# Altium footprint library SMDLibrary.PcbLib: 309 footprints (part 1 of 20)
Each footprint in its own frame and in the unit in brackets; x right, y up, seen from the top. Pads: shape width x height; smd on the part's side, far side on the other; paste and mask are expansions set on the pad; w line width, h text height; cw(c..) or ccw(c..) is an arc to the next point about the centre after c.
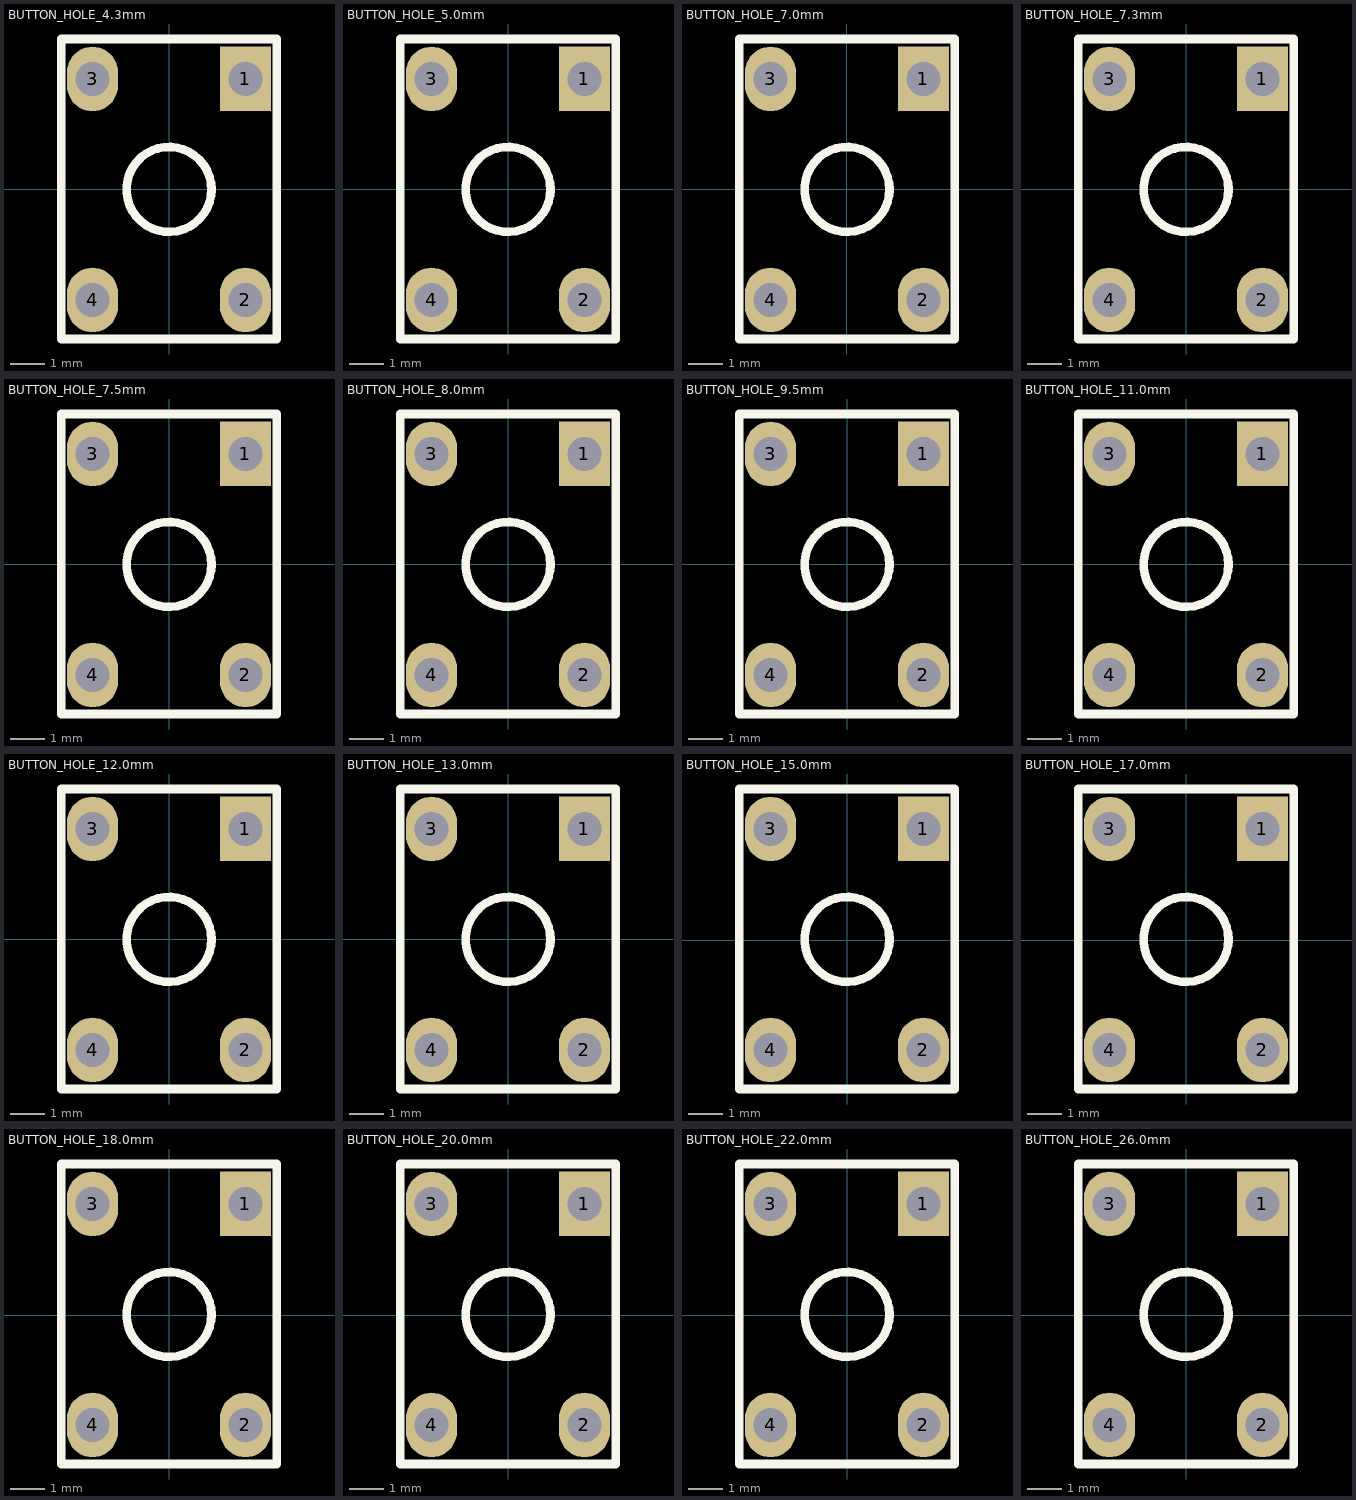
[diagram p0: the footprints below, top view; thin cyan lines are the x and y axes]

## BUTTON_HOLE_4.3mm [mm]
pads (4):
  rect 1.5x1.9 hole 1: 1(2.25,3.25)
  oval 1.5x1.9 hole 1: 2(2.25,-3.25) 3(-2.25,3.25) 4(-2.25,-3.25)
Top Overlay:
  circle w0.254: c0,0 r1.25
  lines w0.254: -3.175,-4.4 3.175,-4.4 3.175,4.425 -3.175,4.425 -3.175,-4.4
3D body "button_hole_6x6x4.3.stp": height 4.3, standoff -3.5, extent -3,-3.863 3,3.863

## BUTTON_HOLE_5.0mm [mm]
pads (4):
  rect 1.5x1.9 hole 1: 1(2.25,3.25)
  oval 1.5x1.9 hole 1: 2(2.25,-3.25) 3(-2.25,3.25) 4(-2.25,-3.25)
Top Overlay:
  circle w0.254: c0,0 r1.25
  lines w0.254: -3.175,-4.4 3.175,-4.4 3.175,4.425 -3.175,4.425 -3.175,-4.4
3D body "button_hole_6x6x5.0.stp": height 5, standoff -3.5, extent -3,-3.863 3,3.863

## BUTTON_HOLE_7.0mm [mm]
pads (4):
  rect 1.5x1.9 hole 1: 1(2.25,3.25)
  oval 1.5x1.9 hole 1: 2(2.25,-3.25) 3(-2.25,3.25) 4(-2.25,-3.25)
Top Overlay:
  circle w0.254: c0,0 r1.25
  lines w0.254: -3.175,-4.4 3.175,-4.4 3.175,4.425 -3.175,4.425 -3.175,-4.4
3D body "button_hole_6x6x7.0.stp": height 7, standoff -3.5, extent -3,-3.863 3,3.863

## BUTTON_HOLE_7.3mm [mm]
pads (4):
  rect 1.5x1.9 hole 1: 1(2.25,3.25)
  oval 1.5x1.9 hole 1: 2(2.25,-3.25) 3(-2.25,3.25) 4(-2.25,-3.25)
Top Overlay:
  circle w0.254: c0,0 r1.25
  lines w0.254: -3.175,-4.4 3.175,-4.4 3.175,4.425 -3.175,4.425 -3.175,-4.4
3D body "button_hole_6x6x7.3.stp": height 7.3, standoff -3.5, extent -3,-3.863 3,3.864

## BUTTON_HOLE_7.5mm [mm]
pads (4):
  rect 1.5x1.9 hole 1: 1(2.25,3.25)
  oval 1.5x1.9 hole 1: 2(2.25,-3.25) 3(-2.25,3.25) 4(-2.25,-3.25)
Top Overlay:
  circle w0.254: c0,0 r1.25
  lines w0.254: -3.175,-4.4 3.175,-4.4 3.175,4.425 -3.175,4.425 -3.175,-4.4
3D body "button_hole_6x6x7.5.stp": height 7.5, standoff -3.5, extent -3,-3.863 3,3.863

## BUTTON_HOLE_8.0mm [mm]
pads (4):
  rect 1.5x1.9 hole 1: 1(2.25,3.25)
  oval 1.5x1.9 hole 1: 2(2.25,-3.25) 3(-2.25,3.25) 4(-2.25,-3.25)
Top Overlay:
  circle w0.254: c0,0 r1.25
  lines w0.254: -3.175,-4.4 3.175,-4.4 3.175,4.425 -3.175,4.425 -3.175,-4.4
3D body "button_hole_6x6x8.0.stp": height 8, standoff -3.5, extent -3,-3.863 3,3.863

## BUTTON_HOLE_9.5mm [mm]
pads (4):
  rect 1.5x1.9 hole 1: 1(2.25,3.25)
  oval 1.5x1.9 hole 1: 2(2.25,-3.25) 3(-2.25,3.25) 4(-2.25,-3.25)
Top Overlay:
  circle w0.254: c0,0 r1.25
  lines w0.254: -3.175,-4.4 -3.175,4.425 3.175,4.425 3.175,-4.4 -3.175,-4.4
3D body "button_hole_6x6x9.5.stp": height 9.5, standoff -3.5, extent -3,-3.863 3,3.863

## BUTTON_HOLE_11.0mm [mm]
pads (4):
  rect 1.5x1.9 hole 1: 1(2.25,3.25)
  oval 1.5x1.9 hole 1: 2(2.25,-3.25) 3(-2.25,3.25) 4(-2.25,-3.25)
Top Overlay:
  circle w0.254: c0,0 r1.25
  lines w0.254: -3.175,-4.4 -3.175,4.425 3.175,4.425 3.175,-4.4 -3.175,-4.4
3D body "button_hole_6x6x11.0.stp": height 11, standoff -3.5, extent -3,-3.863 3,3.863

## BUTTON_HOLE_12.0mm [mm]
pads (4):
  rect 1.5x1.9 hole 1: 1(2.25,3.25)
  oval 1.5x1.9 hole 1: 2(2.25,-3.25) 3(-2.25,3.25) 4(-2.25,-3.25)
Top Overlay:
  circle w0.254: c0,0 r1.25
  lines w0.254: -3.175,-4.4 -3.175,4.425 3.175,4.425 3.175,-4.4 -3.175,-4.4
3D body "button_hole_6x6x12.0.stp": height 12, standoff -3.5, extent -3,-3.863 3,3.863

## BUTTON_HOLE_13.0mm [mm]
pads (4):
  rect 1.5x1.9 hole 1: 1(2.25,3.25)
  oval 1.5x1.9 hole 1: 2(2.25,-3.25) 3(-2.25,3.25) 4(-2.25,-3.25)
Top Overlay:
  circle w0.254: c0,0 r1.25
  lines w0.254: -3.175,-4.4 -3.175,4.425 3.175,4.425 3.175,-4.4 -3.175,-4.4
3D body "button_hole_6x6x13.0.stp": height 13, standoff -3.5, extent -3,-3.863 3,3.863

## BUTTON_HOLE_15.0mm [mm]
pads (4):
  rect 1.5x1.9 hole 1: 1(2.25,3.275)
  oval 1.5x1.9 hole 1: 2(2.25,-3.225) 3(-2.25,3.275) 4(-2.25,-3.225)
Top Overlay:
  circle w0.254: c0,0.025 r1.25
  lines w0.254: -3.175,-4.375 3.175,-4.375 3.175,4.45 -3.175,4.45 -3.175,-4.375
3D body "button_hole_6x6x15.0.stp": height 15, standoff -3.5, extent -3,-3.863 3,3.863

## BUTTON_HOLE_17.0mm [mm]
pads (4):
  rect 1.5x1.9 hole 1: 1(2.25,3.275)
  oval 1.5x1.9 hole 1: 2(2.25,-3.225) 3(-2.25,3.275) 4(-2.25,-3.225)
Top Overlay:
  circle w0.254: c0,0.025 r1.25
  lines w0.254: -3.175,-4.375 -3.175,4.45 3.175,4.45 3.175,-4.375 -3.175,-4.375
3D body "button_hole_6x6x17.0.stp": height 17, standoff -3.5, extent -3,-3.863 3,3.863

## BUTTON_HOLE_18.0mm [mm]
pads (4):
  rect 1.5x1.9 hole 1: 1(2.25,3.275)
  oval 1.5x1.9 hole 1: 2(2.25,-3.225) 3(-2.25,3.275) 4(-2.25,-3.225)
Top Overlay:
  circle w0.254: c0,0.025 r1.25
  lines w0.254: -3.175,-4.375 -3.175,4.45 3.175,4.45 3.175,-4.375 -3.175,-4.375
3D body "button_hole_6x6x18.0.stp": height 18, standoff -3.5, extent -3,-3.863 3,3.863

## BUTTON_HOLE_20.0mm [mm]
pads (4):
  rect 1.5x1.9 hole 1: 1(2.25,3.275)
  oval 1.5x1.9 hole 1: 2(2.25,-3.225) 3(-2.25,3.275) 4(-2.25,-3.225)
Top Overlay:
  circle w0.254: c0,0.025 r1.25
  lines w0.254: -3.175,-4.375 -3.175,4.45 3.175,4.45 3.175,-4.375 -3.175,-4.375
3D body "button_hole_6x6x20.0.stp": height 20, standoff -3.5, extent -3,-3.863 3,3.863

## BUTTON_HOLE_22.0mm [mm]
pads (4):
  rect 1.5x1.9 hole 1: 1(2.25,3.275)
  oval 1.5x1.9 hole 1: 2(2.25,-3.225) 3(-2.25,3.275) 4(-2.25,-3.225)
Top Overlay:
  circle w0.254: c0,0.025 r1.25
  lines w0.254: -3.175,-4.375 -3.175,4.45 3.175,4.45 3.175,-4.375 -3.175,-4.375
3D body "button_hole_6x6x22.0.stp": height 22, standoff -3.5, extent -3,-3.863 3,3.863

## BUTTON_HOLE_26.0mm [mm]
pads (4):
  rect 1.5x1.9 hole 1: 1(2.25,3.275)
  oval 1.5x1.9 hole 1: 2(2.25,-3.225) 3(-2.25,3.275) 4(-2.25,-3.225)
Top Overlay:
  circle w0.254: c0,0.025 r1.25
  lines w0.254: -3.175,-4.375 3.175,-4.375 3.175,4.45 -3.175,4.45 -3.175,-4.375
3D body "button_hole_6x6x26.0.stp": height 26, standoff -3.5, extent -3,-3.863 3,3.863